# Altium footprint library IC.PcbLib: 32 footprints (part 2 of 2)
Each footprint in its own frame and in the unit in brackets; x right, y up, seen from the top. Pads: shape width x height; smd on the part's side, far side on the other; paste and mask are expansions set on the pad; w line width, h text height; cw(c..) or ccw(c..) is an arc to the next point about the centre after c.
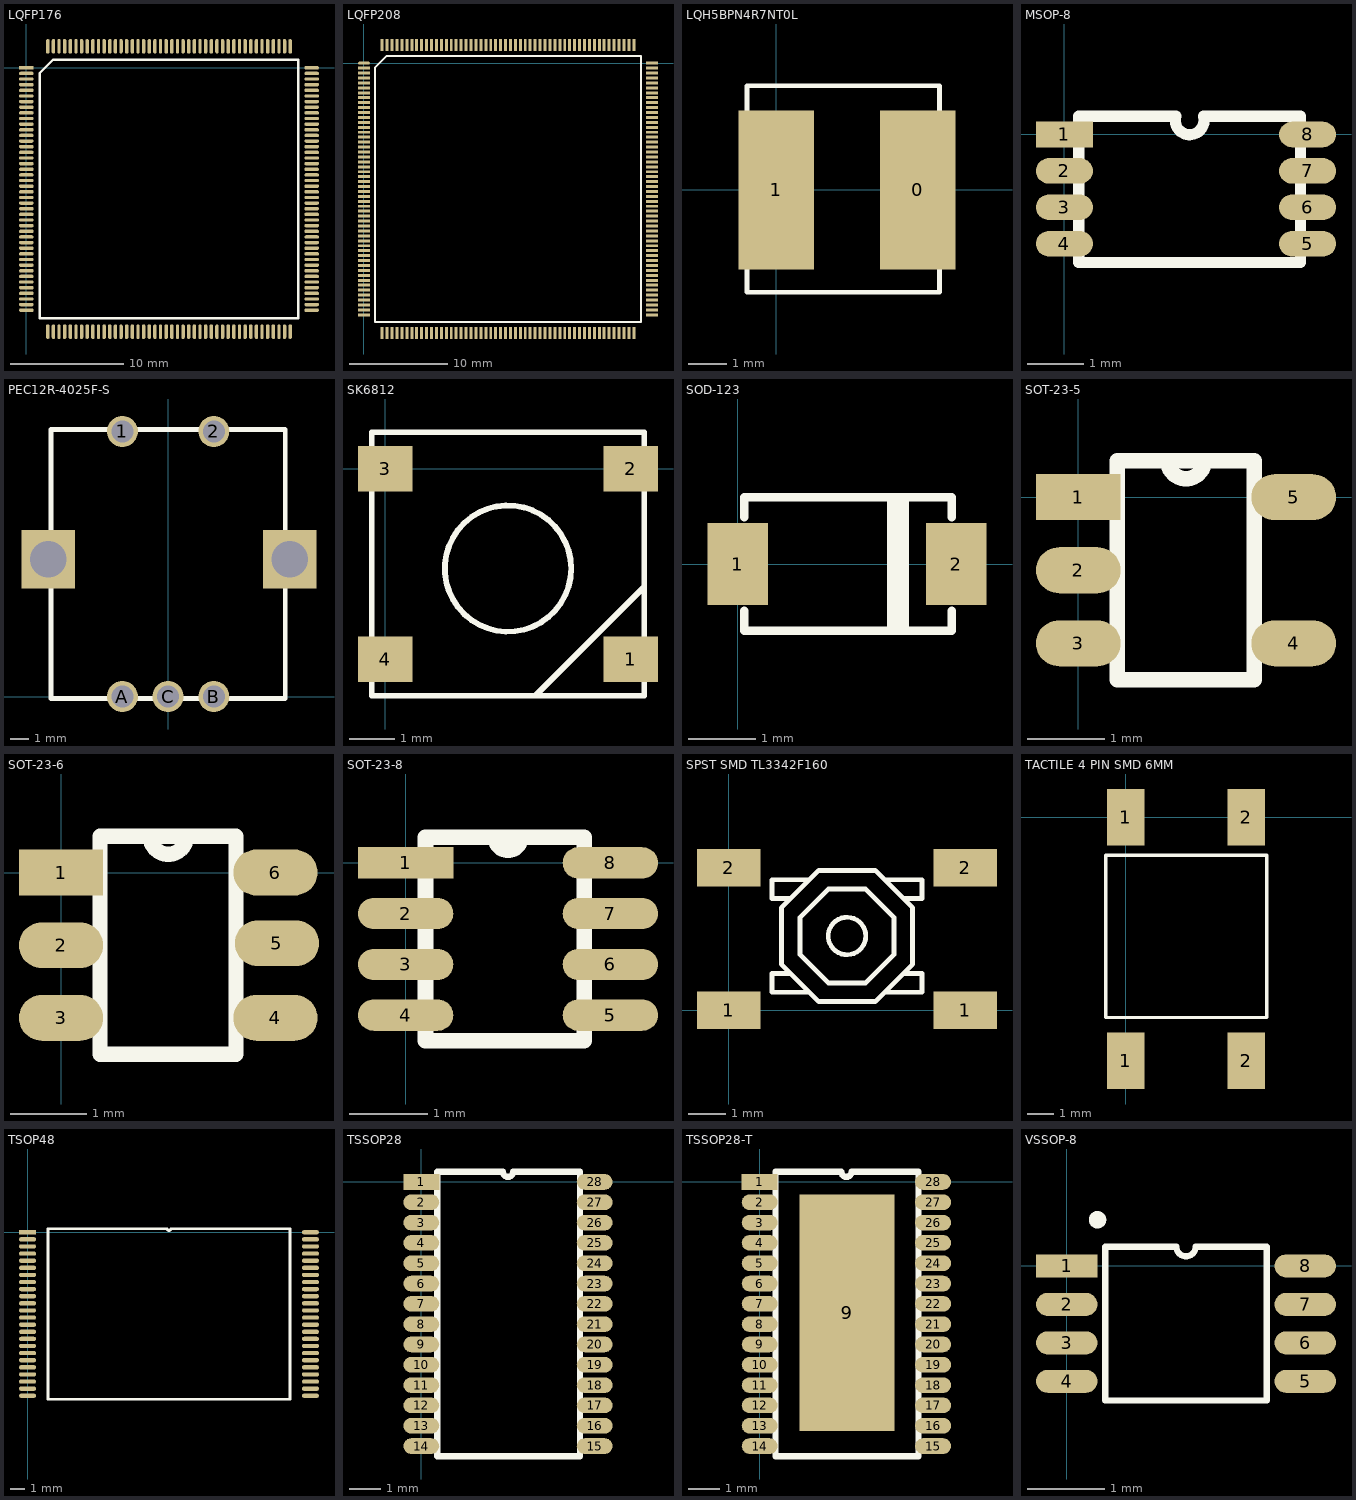
[diagram p1: the footprints below, top view; thin cyan lines are the x and y axes]

## LQFP176 [mm]
pads (176):
  rect 1.3x0.3 smd: 1(0,0)
  oval 1.3x0.3 smd: 2(0,-0.5) 3(0,-1) 4(0,-1.5) 5(0,-2) 6(0,-2.5) 7(0,-3) 8(0,-3.5) 9(0,-4) 10(0,-4.5) 11(0,-5) 12(0,-5.5) 13(0,-6) 14(0,-6.5) 15(0,-7) 16(0,-7.5) 17(0,-8) 18(0,-8.5) 19(0,-9) 20(0,-9.5) 21(0,-10) 22(0,-10.5) 23(0,-11) 24(0,-11.5) 25(0,-12) 26(0,-12.5) 27(0,-13) 28(0,-13.5) 29(0,-14) 30(0,-14.5) 31(0,-15) 32(0,-15.5) 33(0,-16) 34(0,-16.5) 35(0,-17) 36(0,-17.5) 37(0,-18) 38(0,-18.5) 39(0,-19) 40(0,-19.5) 41(0,-20) 42(0,-20.5) 43(0,-21) 44(0,-21.5) 89(25.3,-21.5) 90(25.3,-21) 91(25.3,-20.5) 92(25.3,-20) 93(25.3,-19.5) 94(25.3,-19) 95(25.3,-18.5) 96(25.3,-18) 97(25.3,-17.5) 98(25.3,-17) 99(25.3,-16.5) 100(25.3,-16) 101(25.3,-15.5) 102(25.3,-15) 103(25.3,-14.5) 104(25.3,-14) 105(25.3,-13.5) 106(25.3,-13) 107(25.3,-12.5) 108(25.3,-12) 109(25.3,-11.5) 110(25.3,-11) 111(25.3,-10.5) 112(25.3,-10) 113(25.3,-9.5) 114(25.3,-9) 115(25.3,-8.5) 116(25.3,-8) 117(25.3,-7.5) 118(25.3,-7) 119(25.3,-6.5) 120(25.3,-6) 121(25.3,-5.5) 122(25.3,-5) 123(25.3,-4.5) 124(25.3,-4) 125(25.3,-3.5) 126(25.3,-3) 127(25.3,-2.5) 128(25.3,-2) 129(25.3,-1.5) 130(25.3,-1) 131(25.3,-0.5) 132(25.3,0)
  oval 0.3x1.3 smd: 45(1.9,-23.4) 46(2.4,-23.4) 47(2.9,-23.4) 48(3.4,-23.4) 49(3.9,-23.4) 50(4.4,-23.4) 51(4.9,-23.4) 52(5.4,-23.4) 53(5.9,-23.4) 54(6.4,-23.4) 55(6.9,-23.4) 56(7.4,-23.4) 57(7.9,-23.4) 58(8.4,-23.4) 59(8.9,-23.4) 60(9.4,-23.4) 61(9.9,-23.4) 62(10.4,-23.4) 63(10.9,-23.4) 64(11.4,-23.4) 65(11.9,-23.4) 66(12.4,-23.4) 67(12.9,-23.4) 68(13.4,-23.4) 69(13.9,-23.4) 70(14.4,-23.4) 71(14.9,-23.4) 72(15.4,-23.4) 73(15.9,-23.4) 74(16.4,-23.4) 75(16.9,-23.4) 76(17.4,-23.4) 77(17.9,-23.4) 78(18.4,-23.4) 79(18.9,-23.4) 80(19.4,-23.4) 81(19.9,-23.4) 82(20.4,-23.4) 83(20.9,-23.4) 84(21.4,-23.4) 85(21.9,-23.4) 86(22.4,-23.4) 87(22.9,-23.4) 88(23.4,-23.4) 133(23.4,1.9) 134(22.9,1.9) 135(22.4,1.9) 136(21.9,1.9) 137(21.4,1.9) 138(20.9,1.9) 139(20.4,1.9) 140(19.9,1.9) 141(19.4,1.9) 142(18.9,1.9) 143(18.4,1.9) 144(17.9,1.9) 145(17.4,1.9) 146(16.9,1.9) 147(16.4,1.9) 148(15.9,1.9) 149(15.4,1.9) 150(14.9,1.9) 151(14.4,1.9) 152(13.9,1.9) 153(13.4,1.9) 154(12.9,1.9) 155(12.4,1.9) 156(11.9,1.9) 157(11.4,1.9) 158(10.9,1.9) 159(10.4,1.9) 160(9.9,1.9) 161(9.4,1.9) 162(8.9,1.9) 163(8.4,1.9) 164(7.9,1.9) 165(7.4,1.9) 166(6.9,1.9) 167(6.4,1.9) 168(5.9,1.9) 169(5.4,1.9) 170(4.9,1.9) 171(4.4,1.9) 172(3.9,1.9) 173(3.4,1.9) 174(2.9,1.9) 175(2.4,1.9) 176(1.9,1.9)
Top Overlay:
  lines w0.2: 1.185,-22.215 1.185,-0.47 2.37,0.715 24.115,0.715 24.115,-22.215 1.185,-22.215
3D body "User Library-LQFP176-0_5.STEP": height 1.55, standoff -0.02, extent -0.232,-23.642 25.54,2.13

## LQFP208 [mm]
pads (208):
  oval 1.2x0.3 smd: 1(0,0)
  rect 1.2x0.3 smd: 2(0,-0.5) 3(0,-1) 4(0,-1.5) 5(0,-2) 6(0,-2.5) 7(0,-3) 8(0,-3.5) 9(0,-4) 10(0,-4.5) 11(0,-5) 12(0,-5.5) 13(0,-6) 14(0,-6.5) 15(0,-7) 16(0,-7.5) 17(0,-8) 18(0,-8.5) 19(0,-9) 20(0,-9.5) 21(0,-10) 22(0,-10.5) 23(0,-11) 24(0,-11.5) 25(0,-12) 26(0,-12.5) 27(0,-13) 28(0,-13.5) 29(0,-14) 30(0,-14.5) 31(0,-15) 32(0,-15.5) 33(0,-16) 34(0,-16.5) 35(0,-17) 36(0,-17.5) 37(0,-18) 38(0,-18.5) 39(0,-19) 40(0,-19.5) 41(0,-20) 42(0,-20.5) 43(0,-21) 44(0,-21.5) 45(0,-22) 46(0,-22.5) 47(0,-23) 48(0,-23.5) 49(0,-24) 50(0,-24.5) 51(0,-25) 52(0,-25.5) 105(29.2,-25.5) 106(29.2,-25) 107(29.2,-24.5) 108(29.2,-24) 109(29.2,-23.5) 110(29.2,-23) 111(29.2,-22.5) 112(29.2,-22) 113(29.2,-21.5) 114(29.2,-21) 115(29.2,-20.5) 116(29.2,-20) 117(29.2,-19.5) 118(29.2,-19) 119(29.2,-18.5) 120(29.2,-18) 121(29.2,-17.5) 122(29.2,-17) 123(29.2,-16.5) 124(29.2,-16) 125(29.2,-15.5) 126(29.2,-15) 127(29.2,-14.5) 128(29.2,-14) 129(29.2,-13.5) 130(29.2,-13) 131(29.2,-12.5) 132(29.2,-12) 133(29.2,-11.5) 134(29.2,-11) 135(29.2,-10.5) 136(29.2,-10) 137(29.2,-9.5) 138(29.2,-9) 139(29.2,-8.5) 140(29.2,-8) 141(29.2,-7.5) 142(29.2,-7) 143(29.2,-6.5) 144(29.2,-6) 145(29.2,-5.5) 146(29.2,-5) 147(29.2,-4.5) 148(29.2,-4) 149(29.2,-3.5) 150(29.2,-3) 151(29.2,-2.5) 152(29.2,-2) 153(29.2,-1.5) 154(29.2,-1) 155(29.2,-0.5) 156(29.2,0)
  rect 0.3x1.2 smd: 53(1.85,-27.35) 54(2.35,-27.35) 55(2.85,-27.35) 56(3.35,-27.35) 57(3.85,-27.35) 58(4.35,-27.35) 59(4.85,-27.35) 60(5.35,-27.35) 61(5.85,-27.35) 62(6.35,-27.35) 63(6.85,-27.35) 64(7.35,-27.35) 65(7.85,-27.35) 66(8.35,-27.35) 67(8.85,-27.35) 68(9.35,-27.35) 69(9.85,-27.35) 70(10.35,-27.35) 71(10.85,-27.35) 72(11.35,-27.35) 73(11.85,-27.35) 74(12.35,-27.35) 75(12.85,-27.35) 76(13.35,-27.35) 77(13.85,-27.35) 78(14.35,-27.35) 79(14.85,-27.35) 80(15.35,-27.35) 81(15.85,-27.35) 82(16.35,-27.35) 83(16.85,-27.35) 84(17.35,-27.35) 85(17.85,-27.35) 86(18.35,-27.35) 87(18.85,-27.35) 88(19.35,-27.35) 89(19.85,-27.35) 90(20.35,-27.35) 91(20.85,-27.35) 92(21.35,-27.35) 93(21.85,-27.35) 94(22.35,-27.35) 95(22.85,-27.35) 96(23.35,-27.35) 97(23.85,-27.35) 98(24.35,-27.35) 99(24.85,-27.35) 100(25.35,-27.35) 101(25.85,-27.35) 102(26.35,-27.35) 103(26.85,-27.35) 104(27.35,-27.35) 157(27.35,1.85) 158(26.85,1.85) 159(26.35,1.85) 160(25.85,1.85) 161(25.35,1.85) 162(24.85,1.85) 163(24.35,1.85) 164(23.85,1.85) 165(23.35,1.85) 166(22.85,1.85) 167(22.35,1.85) 168(21.85,1.85) 169(21.35,1.85) 170(20.85,1.85) 171(20.35,1.85) 172(19.85,1.85) 173(19.35,1.85) 174(18.85,1.85) 175(18.35,1.85) 176(17.85,1.85) 177(17.35,1.85) 178(16.85,1.85) 179(16.35,1.85) 180(15.85,1.85) 181(15.35,1.85) 182(14.85,1.85) 183(14.35,1.85) 184(13.85,1.85) 185(13.35,1.85) 186(12.85,1.85) 187(12.35,1.85) 188(11.85,1.85) 189(11.35,1.85) 190(10.85,1.85) 191(10.35,1.85) 192(9.85,1.85) 193(9.35,1.85) 194(8.85,1.85) 195(8.35,1.85) 196(7.85,1.85) 197(7.35,1.85) 198(6.85,1.85) 199(6.35,1.85) 200(5.85,1.85) 201(5.35,1.85) 202(4.85,1.85) 203(4.35,1.85) 204(3.85,1.85) 205(3.35,1.85) 206(2.85,1.85) 207(2.35,1.85) 208(1.85,1.85)
Top Overlay:
  lines w0.2: 1.135,-26.215 28.065,-26.215 28.065,0.715 2.27,0.715 1.135,-0.42 1.135,-26.215
3D body "User Library-LQFP-208.step": height 1.35, standoff -0.05, extent -0.15,-27.5 29.35,2

## LQH5BPN4R7NT0L [mm]
pads (2):
  rect 1.95x4.1 smd: 0(3.65,0) 1(0,0)
Top Overlay:
  lines w0.127: -0.762,-2.642 4.216,-2.642 4.216,2.692 -0.762,2.692 -0.762,-2.642

## MSOP-8 [mil]
pads (8):
  rect 40x18.03 smd: 1(0,0)
  oval 40x18.03 smd: 2(0,-25.59) 3(0,-51.18) 4(0,-76.77) 5(170.91,-76.77) 6(170.91,-51.18) 7(170.91,-25.59) 8(170.91,0)
Top Overlay:
  lines w7.87: 77.86,10 ccw(c88,10) 97.74,12.8 ; 78.38,12.8 10,12.8 10,-90 166,-90 166,12.8 97.68,12.8
3D body "User Library-MSOP8.step": height 42, standoff -1.31, extent -12.19,-100.02 182.2,22.03

## PEC12R-4025F-S [mm]
pads (7):
  round 1.7 hole 1.2: 1(-2.5,14.5) 2(2.5,14.5) A(-2.5,0) B(2.5,0) C(0,0)
  rect 2.9x3.2 hole 2 square: ""(-6.55,7.5) ""(6.65,7.5)
Top Overlay:
  lines w0.254: -6.4,-0.1 6.4,-0.1 6.4,14.6 -3.5,14.6 -6.4,14.6 -6.4,-0.1
3D body "User Library - PEC12R-4025F.stp": height 20, standoff -3.5, extent -7,-0.1 7,14.65

## SK6812 [mm]
pads (4):
  rect 1.2x1 smd: 1(5.4,-4.2) 2(5.4,0) 3(0,0) 4(0,-4.2)
Top Overlay:
  circle w0.127: c2.7,-2.2 r1.389
  lines w0.127: 2.9,-5 3.2,-5 3.3,-5 5.7,-2.6 ; -0.3,-5 5.7,-5 5.7,0.8 -0.2,0.8 -0.3,0.8 -0.3,-5

## SOD-123 [mm]
pads (2):
  rect 0.91x1.22 smd: 1(0,0) 2(3.27,0)
Top Overlay:
  lines w0.127: 0.1,-0.7 0.1,-1 3.2,-1 3.2,-0.7 ; 0.1,0.7 0.1,1 3.2,1 3.2,0.7 ; 2.3,-1 2.3,1 2.4,1 2.4,-1 2.5,-1 2.5,1
3D body "User Library-SOD123.step": height 1.27, standoff 0, extent -0.22,-0.79 3.48,0.81

## SOT-23-5 [mm]
pads (5):
  rect 1.1x0.6 smd: 1(0,0)
  oval 1.1x0.6 smd: 2(0,-0.95) 3(0,-1.9) 4(2.8,-1.9) 5(2.8,0)
Top Overlay:
  lines w0.2: 0.508,-2.375 2.286,-2.375 2.286,0.475 1.162,0.475 ccw(c1.4,0.475) 1.637,0.475 0.508,0.475 0.508,-2.375
3D body "User Library-SOT23-5-2.step": height 1.45, standoff 0, extent -0.006,-2.415 2.794,0.485

## SOT-23-6 [mm]
pads (6):
  rect 1.1x0.6 smd: 1(0,0)
  oval 1.1x0.6 smd: 2(0,-0.95) 3(0,-1.9) 4(2.8,-1.9) 5(2.819,-0.925) 6(2.8,0)
Top Overlay:
  lines w0.2: 0.508,-2.375 0.508,0.475 1.637,0.475 cw(c1.4,0.475) 1.162,0.475 2.286,0.475 2.286,-2.375 0.508,-2.375
3D body "SOT23-6-2.step": height 1.45, standoff 0, extent -0.006,-2.415 2.794,0.485

## SOT-23-8 [mm]
pads (8):
  rect 1.22x0.4 smd: 1(0,0)
  oval 1.22x0.4 smd: 2(0,-0.65) 3(0,-1.3) 4(0,-1.95) 5(2.62,-1.95) 6(2.62,-1.3) 7(2.62,-0.65) 8(2.62,0)
Top Overlay:
  lines w0.2: 0.254,-2.275 2.286,-2.275 2.286,0.325 1.148,0.325 ccw(c1.31,0.325) 1.472,0.325 0.254,0.325 0.254,-2.275
3D body "User Library-sot238.step": height 1.2, standoff 0, extent -0.13,-2.435 2.67,0.505

## SPST SMD TL3342F160 [mm]
pads (4):
  rect 1.7x1 smd: 1(0,0) 1(6.3,0) 2(0,3.8) 2(6.3,3.8)
Top Overlay:
  circle w0.127: c3.15,1.98 r0.5
  lines w0.127: 1.65,0.98 1.15,0.98 1.15,0.48 2.15,0.48 ; 1.65,2.98 1.15,2.98 1.15,3.48 2.15,3.48 ; 4.15,0.48 4.9,0.48 5.15,0.48 5.15,0.98 4.65,0.98 ; 4.15,3.48 5.15,3.48 5.15,2.98 4.65,2.98 ; 1.4,1.23 2.4,0.23 3.9,0.23 4.9,1.23 4.9,2.73 3.9,3.73 2.4,3.73 1.4,2.73 1.4,1.23 ; 1.9,1.48 1.9,2.48 2.65,3.23 3.65,3.23 4.4,2.48 4.4,1.48 3.65,0.73 2.65,0.73 1.9,1.48

## TACTILE 4 PIN SMD 6MM [mm]
pads (4):
  rect 1.4x2.1 smd: 1(0,-9.1) 1(0,0) 2(4.5,-9.1) 2(4.5,0)
Top Overlay:
  lines w0.127: -0.744,-7.479 5.256,-7.479 ; -0.744,-7.453 -0.744,-1.422 5.258,-1.422 5.258,-7.473
3D body "User Library - SPST 6mm Tactile Switch.step": height 5.07, standoff 0.1, extent -0.765,-9.521 5.235,0.479

## TSOP48 [mm]
pads (48):
  rect 1.2x0.3 smd: 1(0,0)
  oval 1.2x0.3 smd: 2(0,-0.5) 3(0,-1) 4(0,-1.5) 5(0,-2) 6(0,-2.5) 7(0,-3) 8(0,-3.5) 9(0,-4) 10(0,-4.5) 11(0,-5) 12(0,-5.5) 13(0,-6) 14(0,-6.5) 15(0,-7) 16(0,-7.5) 17(0,-8) 18(0,-8.5) 19(0,-9) 20(0,-9.5) 21(0,-10) 22(0,-10.5) 23(0,-11) 24(0,-11.5) 25(19.9,-11.5) 26(19.9,-11) 27(19.9,-10.5) 28(19.9,-10) 29(19.9,-9.5) 30(19.9,-9) 31(19.9,-8.5) 32(19.9,-8) 33(19.9,-7.5) 34(19.9,-7) 35(19.9,-6.5) 36(19.9,-6) 37(19.9,-5.5) 38(19.9,-5) 39(19.9,-4.5) 40(19.9,-4) 41(19.9,-3.5) 42(19.9,-3) 43(19.9,-2.5) 44(19.9,-2) 45(19.9,-1.5) 46(19.9,-1) 47(19.9,-0.5) 48(19.9,0)
Top Overlay:
  lines w0.2: 1.435,-11.75 18.465,-11.75 18.465,0.25 10.075,0.25 cw(c9.95,0.25) 9.825,0.25 1.435,0.25 1.435,-11.75
3D body "User Library-TSOP-48.STEP": height 1.05, standoff -0.05, extent -0.103,-11.76 19.9,0.24

## TSSOP28 [mm]
pads (28):
  rect 1.15x0.5 smd: 1(0,0)
  oval 1.15x0.5 smd: 2(0,-0.65) 3(0,-1.3) 4(0,-1.95) 5(0,-2.6) 6(0,-3.25) 7(0,-3.9) 8(0,-4.55) 9(0,-5.2) 10(0,-5.85) 11(0,-6.5) 12(0,-7.15) 13(0,-7.8) 14(0,-8.45) 15(5.55,-8.45) 16(5.55,-7.8) 17(5.55,-7.15) 18(5.55,-6.5) 19(5.55,-5.85) 20(5.55,-5.2) 21(5.55,-4.55) 22(5.55,-3.9) 23(5.55,-3.25) 24(5.55,-2.6) 25(5.55,-1.95) 26(5.55,-1.3) 27(5.55,-0.65) 28(5.55,0)
Top Overlay:
  lines w0.2: 0.508,-8.775 5.08,-8.775 5.08,0.325 2.937,0.325 cw(c2.775,0.325) 2.612,0.325 0.508,0.325 0.508,-8.775
3D body "User Library-tssop28.STEP": height 1.2, standoff 0, extent -0.432,-9.119 5.968,0.681

## TSSOP28-T [mm]
pads (29):
  rect 1.15x0.5 smd: 1(0,0)
  oval 1.15x0.5 smd: 2(0,-0.65) 3(0,-1.3) 4(0,-1.95) 5(0,-2.6) 6(0,-3.25) 7(0,-3.9) 8(0,-4.55) 9(0,-5.2) 10(0,-5.85) 11(0,-6.5) 12(0,-7.15) 13(0,-7.8) 14(0,-8.45) 15(5.55,-8.45) 16(5.55,-7.8) 17(5.55,-7.15) 18(5.55,-6.5) 19(5.55,-5.85) 20(5.55,-5.2) 21(5.55,-4.55) 22(5.55,-3.9) 23(5.55,-3.25) 24(5.55,-2.6) 25(5.55,-1.95) 26(5.55,-1.3) 27(5.55,-0.65) 28(5.55,0)
  rect 3.048x7.569 smd: 9(2.794,-4.191)
Top Overlay:
  lines w0.2: 0.508,-8.775 5.08,-8.775 5.08,0.325 2.937,0.325 cw(c2.775,0.325) 2.612,0.325 0.508,0.325 0.508,-8.775

## VSSOP-8 [mm]
pads (8):
  rect 0.8x0.3 smd: 1(0,0)
  oval 0.8x0.3 smd: 2(0,-0.5) 3(0,-1) 4(0,-1.5) 5(3.1,-1.5) 6(3.1,-1) 7(3.1,-0.5) 8(3.1,0)
Top Overlay:
  circle w0.127: c0.4,0.6 r0.05
  lines w0.08: 0.5,-1.75 0.5,0.25 1.425,0.25 ccw(c1.55,0.25) 1.675,0.25 2.6,0.25 2.6,-1.75 0.5,-1.75
3D body "User Library-VSSOP-8.step": height 0.9, standoff 0, extent -0.05,-1.8 3.15,0.3